# Altium schematic symbol library LATTICEPLDS_Library.SchLib: 291 symbols (part 25 of 32)
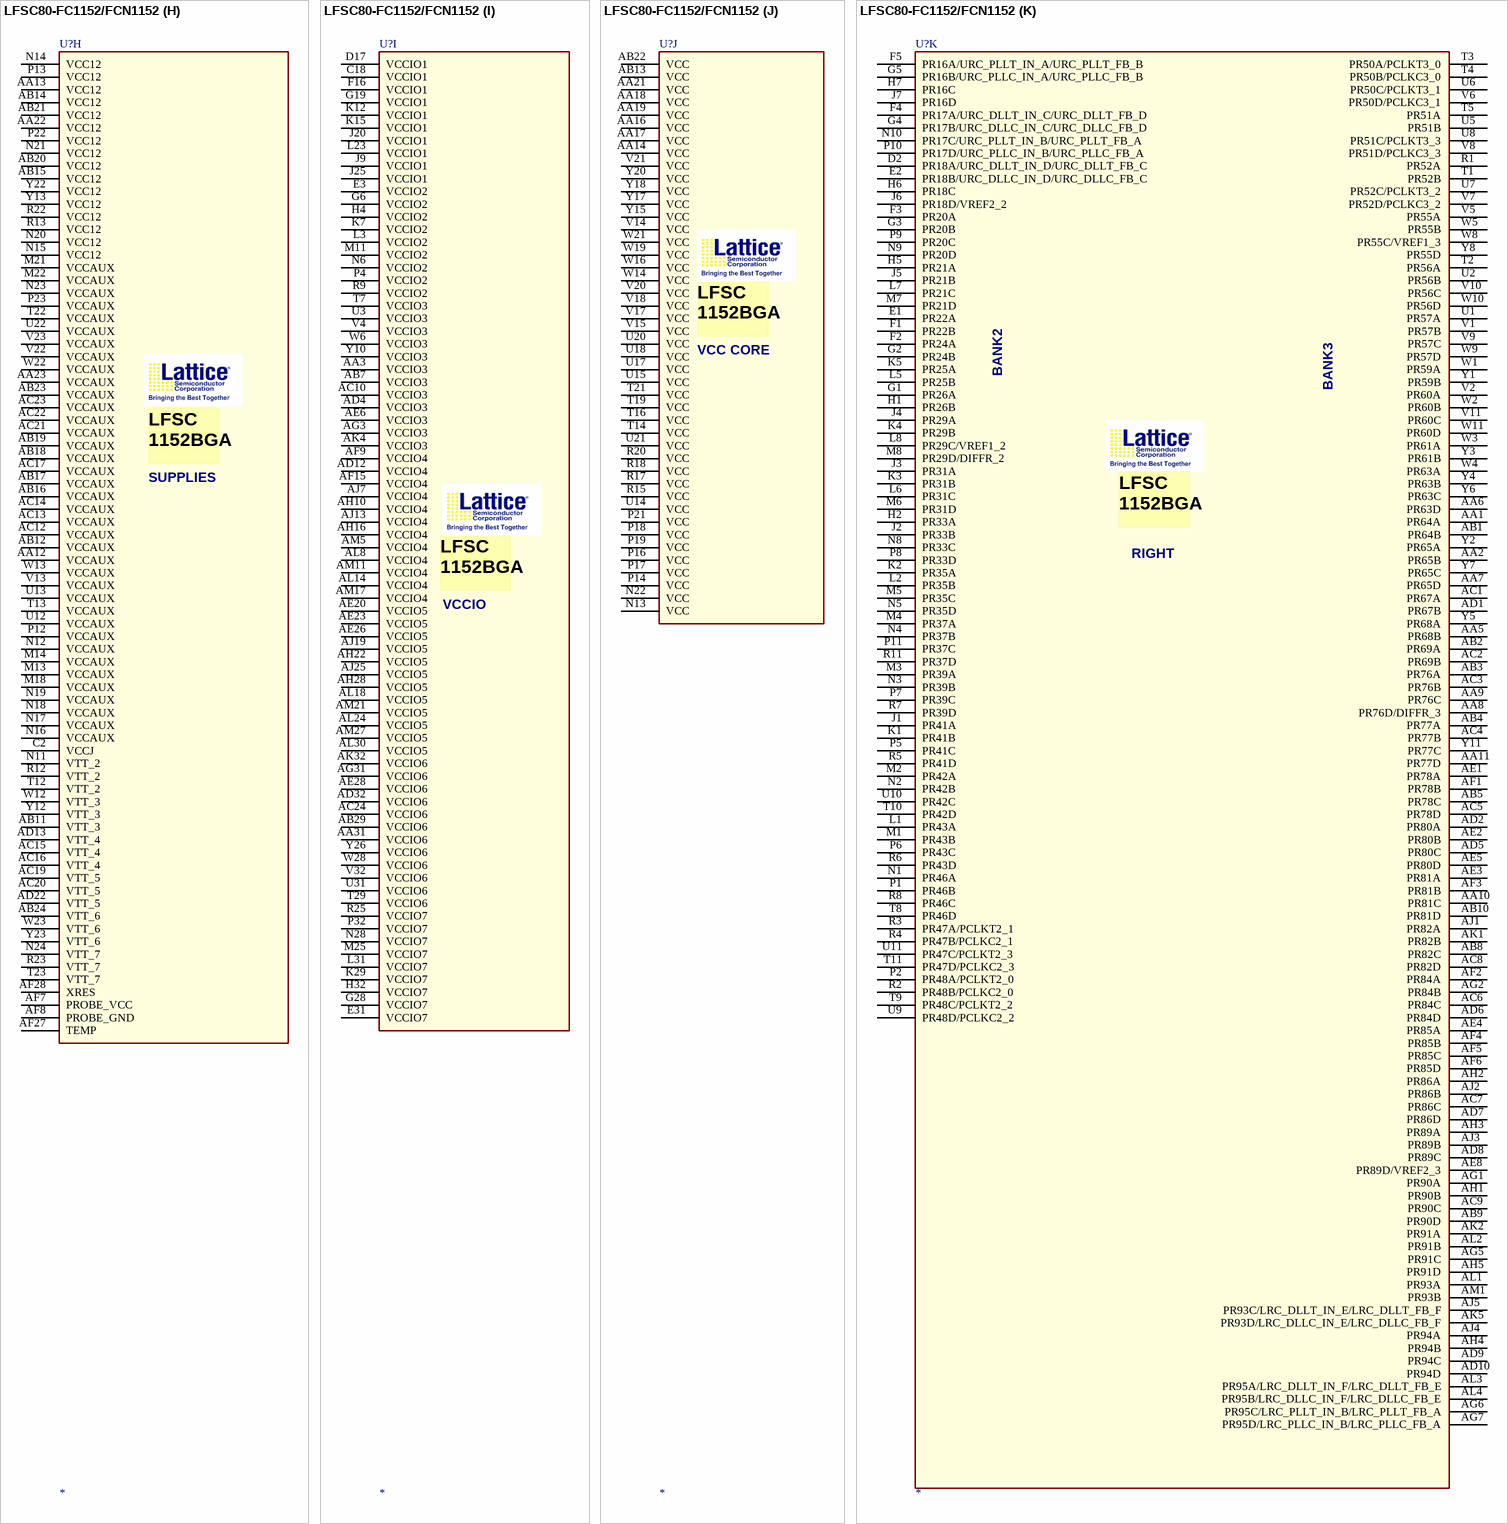
[diagram p327: symbol LFSC80-FC1152/FCN1152]

## LFSC80-FC1152/FCN1152
designator U?
SPLIT_INST: TRUE; SWAP_INFO: (S1+S2+S3+S4+S5+S6+S7+S8+S9+S10+S11)
part A pins: A3 A_HDINP0_R, A4 A_HDOUTP0_R, A5 A_HDOUTP1_R, A6 A_HDINP1_R, A7 A_HDINP2_R, A8 A_HDOUTP2_R, A9 A_HDOUTP3_R, A10 A_HDINP3_R, A11 B_HDOUTP0_R, A12 B_HDOUTP1_R, A13 B_HDOUTP2_R, A14 B_HDOUTP3_R, A21 B_HDOUTP3_L, A22 B_HDOUTP2_L, A23 B_HDOUTP1_L, A24 B_HDOUTP0_L, A25 A_HDINP3_L, A26 A_HDOUTP3_L, A27 A_HDOUTP2_L, A28 A_HDINP2_L, A29 A_HDINP1_L, A30 A_HDOUTP1_L, A31 A_HDOUTP0_L, A32 A_HDINP0_L, B3 A_HDINN0_R, B4 A_HDOUTN0_R, B5 A_HDOUTN1_R, B6 A_HDINN1_R, B7 A_HDINN2_R, B8 A_HDOUTN2_R, B9 A_HDOUTN3_R, B10 A_HDINN3_R, B11 B_HDOUTN0_R, B12 B_HDOUTN1_R, B13 B_HDOUTN2_R, B14 B_HDOUTN3_R, B21 B_HDOUTN3_L, B22 B_HDOUTN2_L, B23 B_HDOUTN1_L, B24 B_HDOUTN0_L, B25 A_HDINN3_L, B26 A_HDOUTN3_L, B27 A_HDOUTN2_L, B28 A_HDINN2_L, B29 A_HDINN1_L, B30 A_HDOUTN1_L, B31 A_HDOUTN0_L, B32 A_HDINN0_L, E10 B_HDINP0_R, E11 B_HDINP1_R, E12 B_HDINP2_R, E13 B_HDINP3_R, E22 B_HDINP3_L, E23 B_HDINP2_L, E24 B_HDINP1_L, E25 B_HDINP0_L, F10 B_HDINN0_R, F11 B_HDINN1_R, F12 B_HDINN2_R, F13 B_HDINN3_R, F22 B_HDINN3_L, F23 B_HDINN2_L, F24 B_HDINN1_L, F25 B_HDINN0_L, G8 A_REFCLKP_R, G9 RESERVED2, G26 RESERVED1, G27 A_REFCLKP_L, H8 A_REFCLKN_R, H9 URC_RESP, H11 B_REFCLKP_R, H12 RESERVED5, H23 RESERVED3, H24 B_REFCLKP_L, H26 ULC_RESP, H27 A_REFCLKN_L, J11 B_REFCLKN_R, J12 RESERVED6, J23 RESERVED4, J24 B_REFCLKN_L
part B pins: C3 A_VDDRX0_R (power), C6 A_VDDRX1_R (power), C7 A_VDDRX2_R (power), C10 A_VDDRX3_R (power), C25 A_VDDRX3_L (power), C28 A_VDDRX2_L (power), C29 A_VDDRX1_L (power), C32 A_VDDRX0_L (power), D3 A_VDDIB0_R (power), D4 A_VDDIB1_R (power), D5 A_VDDIB2_R (power), D6 A_VDDIB3_R (power), D7 B_VDDIB0_R (power), D8 B_VDDIB1_R (power), D9 B_VDDIB2_R (power), D10 B_VDDOB0_R (power), D11 B_VDDOB1_R (power), D12 B_VDDOB2_R (power), D13 B_VDDOB3_R (power), D22 B_VDDOB3_L (power), D23 B_VDDOB2_L (power), D24 B_VDDOB1_L (power), D25 B_VDDOB0_L (power), D26 B_VDDIB2_L (power), D27 B_VDDIB1_L (power), D28 B_VDDIB0_L (power), D29 A_VDDIB3_L (power), D30 A_VDDIB2_L (power), D31 A_VDDIB1_L (power), D32 A_VDDIB0_L (power), E5 A_VDDTX0_R (power), E6 A_VDDTX1_R (power), E7 A_VDDTX2_R (power), E8 A_VDDTX3_R (power), E9 B_VDDIB3_R (power), E26 B_VDDIB3_L (power), E27 A_VDDTX3_L (power), E28 A_VDDTX2_L (power), E29 A_VDDTX1_L (power), E30 A_VDDTX0_L (power), F6 A_VDDOB0_R (power), F7 A_VDDOB1_R (power), F8 A_VDDOB2_R (power), F9 A_VDDOB3_R (power), F26 A_VDDOB3_L (power), F27 A_VDDOB2_L (power), F28 A_VDDOB1_L (power), F29 A_VDDOB0_L (power), G10 B_VDDRX0_R (power), G11 B_VDDRX1_R (power), G12 B_VDDRX2_R (power), G13 B_VDDRX3_R (power), G22 B_VDDRX3_L (power), G23 B_VDDRX2_L (power), G24 B_VDDRX1_L (power), G25 B_VDDRX0_L (power), H10 A_VDDP_R (power), H25 A_VDDP_L (power), K10 B_VDDTX0_R (power), K11 B_VDDTX2_R (power), K24 B_VDDTX2_L (power), K25 B_VDDTX0_L (power), L10 B_VDDTX1_R (power), L11 B_VDDTX3_R (power), L13 B_VDDP_R (power), L22 B_VDDP_L (power), L24 B_VDDTX3_L (power), L25 B_VDDTX1_L (power), M12 VDDAX25_R (power), M23 VDDAX25_L (power)
part C pins: AD11 PB115C, AD14 PB80C/PCLKT4_4, AD15 PB80D/PCLKC4_4, AD16 PB74D/PCLKC4_7, AD17 PB66D, AD18 PB60D, AD19 PB52D/PCLKC5_6, AD20 PB48D/PCLKC5_4, AD21 PB48C/PCLKT5_4, AD24 PB11C, AE10 PB119D, AE11 PB115D, AE13 PB101D, AE14 PB101C, AE16 PB74C/PCLKT4_7, AE17 PB66C, AE18 PB60C, AE19 PB52C/PCLKT5_6, AE21 PB27D, AE22 PB27C, AE24 PB11D, AE25 PB7D, AF10 PB119C, AF11 PB107D, AF12 PB107C, AF13 PB99D, AF14 PB99C, AF16 PB70D, AF17 PB67D, AF18 PB61D, AF19 PB56D, AF21 PB29D, AF22 PB29C, AF23 PB21D, AF24 PB21C, AF25 PB7C, AG8 PB124D, AG9 PB124C, AG10 PB109D, AG11 PB109C, AG12 PB111D, AG13 PB111C, AG14 PB75D/PCLKC4_6, AG15 PB75C/PCLKT4_6, AG16 PB70C, AG17 PB67C, AG18 PB61C, AG19 PB56C, AG20 PB55D, AG21 PB55C, AG22 PB19D, AG23 PB19C, AG24 PB17D, AG25 PB17C, AG26 PB4D, AG27 PB4C, AH6 PB125D/LRC_DLLC_IN_D/LRC_DLLC_FB_C, AH8 PB123D, AH9 PB123C/VREF1_4, AH11 PB79D, AH12 PB79C/DIFFR_4, AH14 PB71D, AH15 PB71C, AH17 PB65D, AH18 PB63D, AH20 PB57D, AH21 PB57C, AH23 PB49D, AH24 PB49C/DIFFR_5, AH26 PB5D/VREF1_5, AH27 PB5C, AH29 PB3C/LLC_DLLT_IN_C/LLC_DLLT_FB_D, AJ6 PB125C/LRC_DLLT_IN_D/LRC_DLLT_FB_C, AJ8 PB117D, AJ9 PB117C, AJ11 PB77D, AJ12 PB77C/VREF2_4, AJ14 PB69D, AJ15 PB69C, AJ17 PB65C, AJ18 PB63C, AJ20 PB59D, AJ21 PB59C, AJ23 PB51D/VREF2_5, AJ24 PB51C, AJ26 PB13D, AJ27 PB13C, AJ29 PB3D/LLC_DLLC_IN_C/LLC_DLLC_FB_D, AK6 PB121D, AK7 PB121C, AK8 PB113D, AK9 PB113C, AK10 PB104D, AK11 PB104C, AK12 PB73D, AK13 PB73C, AK14 PB75B/PCLKC4_1, AK15 PB75A/PCLKT4_1, AK16 PB67B, AK17 PB67A, AK18 PB60B, AK19 PB60A, AK20 PB53B/PCLKC5_2, AK21 PB53A/PCLKT5_2, AK22 PB53D/PCLKC5_7, AK23 PB53C/PCLKT5_7, AK24 PB24D, AK25 PB24C, AK26 PB15D, AK27 PB15C, AK28 PB9D, AK29 PB9C, AL6 PB121B, AL7 PB121A, AL9 PB107B, AL10 PB107A, AL12 PB79B/PCLKC4_5, AL13 PB79A/PCLKT4_5, AL15 PB70B, AL16 PB70A, AL19 PB56B, AL20 PB56A, AL22 PB49B/PCLKC5_5, AL23 PB49A/PCLKT5_5, AL25 PB19B, AL26 PB19A, AL28 PB5B, AL29 PB5A, AM2 PB125B/LRC_PLLC_IN_A/LRC_PLLC_FB_B, AM3 PB124A/LRC_DLLT_IN_C/LRC_DLLT_FB_D, AM4 PB124B/LRC_DLLC_IN_C/LRC_DLLC_FB_D, AM6 PB117B, AM7 PB117A, AM9 PB101B, AM10 PB101A, AM12 PB77B/PCLKC4_0, AM13 PB77A/PCLKT4_0, AM15 PB69B, AM16 PB69A, AM19 PB59B, AM20 PB59A, AM22 PB51B/PCLKC5_0, AM23 PB51A/PCLKT5_0, AM25 PB29B, AM26 PB29A, AM28 PB13B, AM29 PB13A, AM31 PB4B/LLC_DLLC_IN_D/LLC_DLLC_FB_C, AM32 PB4A/LLC_DLLT_IN_D/LLC_DLLT_FB_C, AM33 PB3A/LLC_PLLT_IN_A/LLC_PLLT_FB_B, AN2 PB125A/LRC_PLLT_IN_A/LRC_PLLT_FB_B, AN3 PB119B, AN4 PB123B, AN5 PB123A, AN6 PB113B, AN7 PB113A, AN8 PB109B, AN9 PB109A, AN10 PB99B, AN11 PB99A, AN12 PB80B/PCLKC4_3, AN13 PB80A/PCLKT4_3, AN14 PB74B/PCLKC4_2, AN15 PB74A/PCLKT4_2, AN16 PB66B, AN17 PB66A, AN18 PB61B, AN19 PB61A, AN20 PB52B/PCLKC5_1, AN21 PB52A/PCLKT5_1, AN22 PB45B, AN23 PB45A, AN24 PB27B, AN25 PB27A, AN26 PB21B, AN27 PB21A, AN28 PB17B, AN29 PB17A, AN30 PB9B, AN31 PB9A, AN32 PB7A/ODT0, AN33 PB3B/LLC_PLLC_IN_A/LLC_PLLC_FB_B, AP3 PB119A, AP4 PB115B, AP5 PB115A, AP6 PB111B, AP7 PB111A, AP8 PB104B, AP9 PB104A, AP10 PB83B, AP11 PB83A, AP12 PB73B, AP13 PB73A, AP14 PB71B, AP15 PB71A, AP16 PB65B, AP17 PB65A, AP18 PB63B, AP19 PB63A, AP20 PB57B, AP21 PB57A, AP22 PB55B, AP23 PB55A, AP24 PB48B/PCLKC5_3, AP25 PB48A/PCLKT5_3, AP26 PB24B, AP27 PB24A, AP28 PB15B, AP29 PB15A, AP30 PB11B, AP31 PB11A, AP32 PB7B
part D pins: AA24 PL77D, AA25 PL81C, AA26 PL76C, AA27 PL76D/DIFFR_6, AA28 PL65D, AA29 PL63D, AA30 PL68B, AA33 PL65B, AA34 PL64A, AB25 PL81D, AB26 PL90D, AB27 PL82C, AB30 PL78C, AB31 PL77A, AB32 PL76A, AB33 PL69A, AB34 PL64B, AC26 PL90C, AC27 PL82D, AC28 PL86C, AC29 PL84C, AC30 PL78D, AC31 PL77B, AC32 PL76B, AC33 PL69B, AC34 PL67A, AD25 PL94D, AD26 PL94C, AD27 PL89C, AD28 PL86D, AD29 PL84D, AD30 PL80C, AD33 PL80A, AD34 PL67B, AE27 PL89D/VREF2_6, AE30 PL80D, AE31 PL85A, AE32 PL81A, AE33 PL80B, AE34 PL78A, AF29 PL85D, AF30 PL85C, AF31 PL85B, AF32 PL81B, AF33 PL84A, AF34 PL78B, AG28 PL95D/LLC_PLLC_IN_B/LLC_PLLC_FB_A, AG29 PL95C/LLC_PLLT_IN_B/LLC_PLLT_FB_A, AG30 PL91C, AG33 PL84B, AG34 PL90A, AH30 PL91D, AH31 PL94B, AH32 PL89A, AH33 PL86A, AH34 PL90B, AJ30 PL93C/LLC_DLLT_IN_E/LLC_DLLT_FB_F, AJ31 PL94A, AJ32 PL89B, AJ33 PL86B, AJ34 PL82A, AK30 PL93D/LLC_DLLC_IN_E/LLC_DLLC_FB_F, AK33 PL91A, AK34 PL82B, AL31 PL95B/LLC_DLLC_IN_F/LLC_DLLC_FB_E, AL32 PL95A/LLC_DLLT_IN_F/LLC_DLLT_FB_E, AL33 PL91B, AL34 PL93A, AM34 PL93B, D33 PL18A/ULC_DLLT_IN_D/ULC_DLLT_FB_C, E33 PL18B/ULC_DLLC_IN_D/ULC_DLLC_FB_C, E34 PL22A, F30 PL16A/ULC_PLLT_IN_A/ULC_PLLT_FB_B/DEBUG_BUS11, F31 PL17A/ULC_DLLT_IN_C/ULC_DLLT_FB_D/DEBUG_BUS9, F32 PL20A, F33 PL24A, F34 PL22B, G30 PL16B/ULC_PLLC_IN_A/ULC_PLLC_FB_B/DEBUG_BUS10, G31 PL17B/ULC_DLLC_IN_C/ULC_DLLC_FB_D/DEBUG_BUS8, G32 PL20B, G33 PL24B, G34 PL26A, H28 PL16C/DEBUG_BUS13, H29 PL18C/DEBUG_BUS12, H30 PL21A, H33 PL33A, H34 PL26B, J28 PL16D, J29 PL18D/VREF2_7/DEBUG_BUS6, J30 PL21B, J31 PL29A/TESTCFGN, J32 PL31A, J33 PL33B, J34 PL41A, K30 PL25A, K31 PL29B/DEBUG_BUS7, K32 PL31B, K33 PL35A, K34 PL41B, L27 PL29C/VREF1_7/DEBUG_BUS5, L28 PL21C, L29 PL31C, L30 PL25B, L33 PL35B, L34 PL43A, M27 PL29D/DIFFR_7/DEBUG_BUS4, M28 PL21D, M29 PL31D, M30 PL35C, M31 PL37A, M32 PL39A, M33 PL42A, M34 PL43B, N25 PL17C/ULC_PLLT_IN_B/ULC_PLLT_FB_A, N26 PL20D, N27 PL33C, N30 PL35D, N31 PL37B, N32 PL39B, N33 PL42B, N34 PL46A, P24 PL37C, P25 PL17D/ULC_PLLC_IN_B/ULC_PLLC_FB_A, P26 PL20C, P27 PL33D, P28 PL39C, P29 PL43C, P30 PL41C, P33 PL48A/PCLKT7_0/DEBUG_BUS1, P34 PL46B, R24 PL37D, R27 PL46C, R28 PL39D, R29 PL43D, R30 PL41D, R31 PL47B/PCLKC7_1/DEBUG_BUS2, R32 PL47A/PCLKT7_1/DEBUG_BUS3, R33 PL48B/PCLKC7_0/DEBUG_BUS0, R34 PL52A, T24 PL47D/PCLKC7_3, T25 PL42D, T26 PL48C/PCLKT7_2/DEBUG_BUS14, T27 PL46D, T30 PL51A, T31 PL50B/PCLKC6_0, T32 PL50A/PCLKT6_0, T33 PL56A, T34 PL52B, U24 PL47C/PCLKT7_3, U25 PL42C, U26 PL48D/PCLKC7_2/DEBUG_BUS15, U27 PL51C/PCLKT6_3, U28 PL52C/PCLKT6_2, U29 PL50C/PCLKT6_1, U30 PL51B, U33 PL56B, U34 PL57A, V24 PL60C, V25 PL56C, V26 PL57C, V27 PL51D/PCLKC6_3, V28 PL52D/PCLKC6_2, V29 PL50D/PCLKC6_1, V30 PL55A, V33 PL60A, V34 PL57B, W24 PL60D, W25 PL56D, W26 PL57D, W27 PL55C/VREF1_6, W30 PL55B, W31 PL63A, W32 PL61A, W33 PL60B, W34 PL59A, Y24 PL77C, Y27 PL55D, Y28 PL65C, Y29 PL63C, Y30 PL68A, Y31 PL63B, Y32 PL61B, Y33 PL65A, Y34 PL59B
part E pins: A2 GND (power), A33 GND (power), AA4 GND (power), AA15 GND (power), AA20 GND (power), AA32 GND (power), AB6 GND (power), AB28 GND (power), AC11 GND (power), AC18 GND (power), AC25 GND (power), AD3 GND (power), AD23 GND (power), AD31 GND (power), AE7 GND (power), AE9 GND (power), AE12 GND (power), AE15 GND (power), AE29 GND (power), AF20 GND (power), AF26 GND (power), AG4 GND (power), AG32 GND (power), AH7 GND (power), AH13 GND (power), AH19 GND (power), AH25 GND (power), AJ10 GND (power), AJ16 GND (power), AJ22 GND (power), AJ28 GND (power), AK3 GND (power), AK31 GND (power), AL5 GND (power), AL11 GND (power), AL17 GND (power), AL21 GND (power), AL27 GND (power), AM8 GND (power), AM14 GND (power), AM18 GND (power), AM24 GND (power), AM30 GND (power), AN1 GND (power), AN34 GND (power), AP2 GND (power), AP33 GND (power), B1 GND (power), B34 GND (power), C4 GND (power), C5 GND (power), C8 GND (power), C9 GND (power), C11 GND (power), C12 GND (power), C13 GND (power), C14 GND (power), C17 GND (power), C21 GND (power), C22 GND (power), C23 GND (power), C24 GND (power), C26 GND (power), C27 GND (power), C30 GND (power), C31 GND (power), D18 GND (power), E4 GND (power), E32 GND (power), F19 GND (power), G7 GND (power), G16 GND (power), G29 GND (power), H3 GND (power), H31 GND (power), J10 GND (power), J15 GND (power), J26 GND (power), K6 GND (power), K9 GND (power), K20 GND (power), K23 GND (power), K26 GND (power), K28 GND (power), L4 GND (power), L12 GND (power), L32 GND (power), M10 GND (power), M17 GND (power), M24 GND (power), N7 GND (power), N29 GND (power), P3 GND (power), P15 GND (power), P20 GND (power), P31 GND (power), R10 GND (power), R14 GND (power), R16 GND (power), R19 GND (power), R21 GND (power), R26 GND (power), T6 GND (power), T15 GND (power), T17 GND (power), T18 GND (power), T20 GND (power), T28 GND (power), U4 GND (power), U16 GND (power), U19 GND (power), U23 GND (power), U32 GND (power), V3 GND (power), V12 GND (power), V16 GND (power), V19 GND (power), V31 GND (power), W7 GND (power), W15 GND (power), W17 GND (power), W18 GND (power), W20 GND (power), W29 GND (power), Y9 GND (power), Y14 GND (power), Y16 GND (power), Y19 GND (power), Y21 GND (power), Y25 GND (power)
part F pins: A15 PT73A/D1, A16 PT71B/D0, A17 PT65B/PCLKC1_0, A18 PT59B/A7, A19 PT57B/A9, A20 PT55B/A13, B2 CCLK, B15 PT73B/D2, B16 PT71A/QOUT, B17 PT65A/MPICLK/PCLKT1_0, B18 PT59A/A8, B19 PT57A/A10, B20 PT55A/A14, B33 RESETN, C1 TDI, C15 PT67B/EXTCLKP2O, C16 PT67A/EXTCLKP2I, C19 PT61A/A4, C20 PT61B/A3, C33 INITN, C34 RDCFGN, D1 TCK, D14 PT75B/CS0N, D15 PT70B/DOUT, D16 PT69B/EXTCLKP1O, D19 PT60B/A5, D20 PT53B/A15, D21 PT52B/A18, D34 DONE, E14 PT75A/RDN, E15 PT70A/EXTDONEI, E16 PT69A/EXTCLKP1I, E17 PT66B/DP0, E18 PT63B/MPIRTRYN, E19 PT60A/A6, E20 PT53A/A17, E21 PT52A/MPITEAN, F14 PT77B/D8, F15 PT74A/D5, F17 PT66A/MPIACKN, F18 PT63A/A0, F20 PT56B/A11, F21 PT51B/A21, G14 PT77A/CS1, G15 PT74B/D6, G17 PT65D/D23, G18 PT63D/DP3/PCLKC1_4, G20 PT56A/A12, G21 PT51A/D15, H13 PT70C/D18, H14 PT71C/D17/PCLKT1_3, H15 PT67D/D21/PCLKC1_1, H16 PT67C/D22/PCLKT1_1, H17 PT65C/DP2, H18 PT63C/D24/PCLKT1_4, H19 PT59D/D27, H20 PT59C/VREF1_1, H21 PT57D/D28/PCLKC1_6, H22 PT56D/D30/PCLKC1_7, J8 PROGRAMN, J13 PT70D/VREF2_1, J14 PT71D/D16/PCLKC1_3, J16 PT69D/D19/PCLKC1_2, J17 PT69C/D20/PCLKT1_2, J18 PT61D/A1, J19 PT61C/A2, J21 PT57C/D29/PCLKT1_6, J22 PT56C/D31/PCLKT1_7, J27 M0, K8 MPIIRQN, K13 PT73C/D3, K14 PT73D/D4, K16 PT74C/D7, K17 PT66C/RDY, K18 PT60D/D25/PCLKC1_5, K19 PT52C/A20, K21 PT55D/D11, K22 PT55C/D12, K27 M1, L9 TMS, L14 PT75C/D10, L15 PT75D/D9, L16 PT74D/WRN, L17 PT66D/EXTDONEO, L18 PT60C/D26/PCLKT1_5, L19 PT52D/A19, L20 PT53C/D13, L21 PT53D/A16, L26 M3, M9 TDO, M15 PT77D/HDC, M16 PT77C/LDCN, M19 PT51C/DP1, M20 PT51D/D14, M26 M2
part G pins: A1 NC1, A34 NC2, AP1 NC3, AP34 NC4
part H pins: AA12 VCCAUX (power), AA13 VCC12 (power), AA22 VCC12 (power), AA23 VCCAUX (power), AB11 VTT_3 (power), AB12 VCCAUX (power), AB14 VCC12 (power), AB15 VCC12 (power), AB16 VCCAUX (power), AB17 VCCAUX (power), AB18 VCCAUX (power), AB19 VCCAUX (power), AB20 VCC12 (power), AB21 VCC12 (power), AB23 VCCAUX (power), AB24 VTT_6 (power), AC12 VCCAUX (power), AC13 VCCAUX (power), AC14 VCCAUX (power), AC15 VTT_4 (power), AC16 VTT_4 (power), AC17 VCCAUX (power), AC19 VTT_5 (power), AC20 VTT_5 (power), AC21 VCCAUX (power), AC22 VCCAUX (power), AC23 VCCAUX (power), AD13 VTT_4 (power), AD22 VTT_5 (power), AF7 PROBE_VCC, AF8 PROBE_GND, AF27 TEMP, AF28 XRES, C2 VCCJ (power), M13 VCCAUX (power), M14 VCCAUX (power), M18 VCCAUX (power), M21 VCCAUX (power), M22 VCCAUX (power), N11 VTT_2 (power), N12 VCCAUX (power), N14 VCC12 (power), N15 VCC12 (power), N16 VCCAUX (power), N17 VCCAUX (power), N18 VCCAUX (power), N19 VCCAUX (power), N20 VCC12 (power), N21 VCC12 (power), N23 VCCAUX (power), N24 VTT_7 (power), P12 VCCAUX (power), P13 VCC12 (power), P22 VCC12 (power), P23 VCCAUX (power), R12 VTT_2 (power), R13 VCC12 (power), R22 VCC12 (power), R23 VTT_7 (power), T12 VTT_2 (power), T13 VCCAUX (power), T22 VCCAUX (power), T23 VTT_7 (power), U12 VCCAUX (power), U13 VCCAUX (power), U22 VCCAUX (power), V13 VCCAUX (power), V22 VCCAUX (power), V23 VCCAUX (power), W12 VTT_3 (power), W13 VCCAUX (power), W22 VCCAUX (power), W23 VTT_6 (power), Y12 VTT_3 (power), Y13 VCC12 (power), Y22 VCC12 (power), Y23 VTT_6 (power)
part I pins: AA3 VCCIO3 (power), AA31 VCCIO6 (power), AB7 VCCIO3 (power), AB29 VCCIO6 (power), AC10 VCCIO3 (power), AC24 VCCIO6 (power), AD4 VCCIO3 (power), AD12 VCCIO4 (power), AD32 VCCIO6 (power), AE6 VCCIO3 (power), AE20 VCCIO5 (power), AE23 VCCIO5 (power), AE26 VCCIO5 (power), AE28 VCCIO6 (power), AF9 VCCIO4 (power), AF15 VCCIO4 (power), AG3 VCCIO3 (power), AG31 VCCIO6 (power), AH10 VCCIO4 (power), AH16 VCCIO4 (power), AH22 VCCIO5 (power), AH28 VCCIO5 (power), AJ7 VCCIO4 (power), AJ13 VCCIO4 (power), AJ19 VCCIO5 (power), AJ25 VCCIO5 (power), AK4 VCCIO3 (power), AK32 VCCIO6 (power), AL8 VCCIO4 (power), AL14 VCCIO4 (power), AL18 VCCIO5 (power), AL24 VCCIO5 (power), AL30 VCCIO5 (power), AM5 VCCIO4 (power), AM11 VCCIO4 (power), AM17 VCCIO4 (power), AM21 VCCIO5 (power), AM27 VCCIO5 (power), C18 VCCIO1 (power), D17 VCCIO1 (power), E3 VCCIO2 (power), E31 VCCIO7 (power), F16 VCCIO1 (power), G6 VCCIO2 (power), G19 VCCIO1 (power), G28 VCCIO7 (power), H4 VCCIO2 (power), H32 VCCIO7 (power), J9 VCCIO1 (power), J20 VCCIO1 (power), J25 VCCIO1 (power), K7 VCCIO2 (power), K12 VCCIO1 (power), K15 VCCIO1 (power), K29 VCCIO7 (power), L3 VCCIO2 (power), L23 VCCIO1 (power), L31 VCCIO7 (power), M11 VCCIO2 (power), M25 VCCIO7 (power), N6 VCCIO2 (power), N28 VCCIO7 (power), P4 VCCIO2 (power), P32 VCCIO7 (power), R9 VCCIO2 (power), R25 VCCIO7 (power), T7 VCCIO3 (power), T29 VCCIO6 (power), U3 VCCIO3 (power), U31 VCCIO6 (power), V4 VCCIO3 (power), V32 VCCIO6 (power), W6 VCCIO3 (power), W28 VCCIO6 (power), Y10 VCCIO3 (power), Y26 VCCIO6 (power)
part J pins: AA14 VCC (power), AA16 VCC (power), AA17 VCC (power), AA18 VCC (power), AA19 VCC (power), AA21 VCC (power), AB13 VCC (power), AB22 VCC (power), N13 VCC (power), N22 VCC (power), P14 VCC (power), P16 VCC (power), P17 VCC (power), P18 VCC (power), P19 VCC (power), P21 VCC (power), R15 VCC (power), R17 VCC (power), R18 VCC (power), R20 VCC (power), T14 VCC (power), T16 VCC (power), T19 VCC (power), T21 VCC (power), U14 VCC (power), U15 VCC (power), U17 VCC (power), U18 VCC (power), U20 VCC (power), U21 VCC (power), V14 VCC (power), V15 VCC (power), V17 VCC (power), V18 VCC (power), V20 VCC (power), V21 VCC (power), W14 VCC (power), W16 VCC (power), W19 VCC (power), W21 VCC (power), Y15 VCC (power), Y17 VCC (power), Y18 VCC (power), Y20 VCC (power)
part K pins: AA1 PR64A, AA2 PR65B, AA5 PR68B, AA6 PR63D, AA7 PR65D, AA8 PR76D/DIFFR_3, AA9 PR76C, AA10 PR81C, AA11 PR77D, AB1 PR64B, AB2 PR69A, AB3 PR76A, AB4 PR77A, AB5 PR78C, AB8 PR82C, AB9 PR90D, AB10 PR81D, AC1 PR67A, AC2 PR69B, AC3 PR76B, AC4 PR77B, AC5 PR78D, AC6 PR84C, AC7 PR86C, AC8 PR82D, AC9 PR90C, AD1 PR67B, AD2 PR80A, AD5 PR80C, AD6 PR84D, AD7 PR86D, AD8 PR89C, AD9 PR94C, AD10 PR94D, AE1 PR78A, AE2 PR80B, AE3 PR81A, AE4 PR85A, AE5 PR80D, AE8 PR89D/VREF2_3, AF1 PR78B, AF2 PR84A, AF3 PR81B, AF4 PR85B, AF5 PR85C, AF6 PR85D, AG1 PR90A, AG2 PR84B, AG5 PR91C, AG6 PR95C/LRC_PLLT_IN_B/LRC_PLLT_FB_A, AG7 PR95D/LRC_PLLC_IN_B/LRC_PLLC_FB_A, AH1 PR90B, AH2 PR86A, AH3 PR89A, AH4 PR94B, AH5 PR91D, AJ1 PR82A, AJ2 PR86B, AJ3 PR89B, AJ4 PR94A, AJ5 PR93C/LRC_DLLT_IN_E/LRC_DLLT_FB_F, AK1 PR82B, AK2 PR91A, AK5 PR93D/LRC_DLLC_IN_E/LRC_DLLC_FB_F, AL1 PR93A, AL2 PR91B, AL3 PR95A/LRC_DLLT_IN_F/LRC_DLLT_FB_E, AL4 PR95B/LRC_DLLC_IN_F/LRC_DLLC_FB_E, AM1 PR93B, D2 PR18A/URC_DLLT_IN_D/URC_DLLT_FB_C, E1 PR22A, E2 PR18B/URC_DLLC_IN_D/URC_DLLC_FB_C, F1 PR22B, F2 PR24A, F3 PR20A, F4 PR17A/URC_DLLT_IN_C/URC_DLLT_FB_D, F5 PR16A/URC_PLLT_IN_A/URC_PLLT_FB_B, G1 PR26A, G2 PR24B, G3 PR20B, G4 PR17B/URC_DLLC_IN_C/URC_DLLC_FB_D, G5 PR16B/URC_PLLC_IN_A/URC_PLLC_FB_B, H1 PR26B, H2 PR33A, H5 PR21A, H6 PR18C, H7 PR16C, J1 PR41A, J2 PR33B, J3 PR31A, J4 PR29A, J5 PR21B, J6 PR18D/VREF2_2, J7 PR16D, K1 PR41B, K2 PR35A, K3 PR31B, K4 PR29B, K5 PR25A, L1 PR43A, L2 PR35B, L5 PR25B, L6 PR31C, L7 PR21C, L8 PR29C/VREF1_2, M1 PR43B, M2 PR42A, M3 PR39A, M4 PR37A, M5 PR35C, M6 PR31D, M7 PR21D, M8 PR29D/DIFFR_2, N1 PR46A, N2 PR42B, N3 PR39B, N4 PR37B, N5 PR35D, N8 PR33C, N9 PR20D, N10 PR17C/URC_PLLT_IN_B/URC_PLLT_FB_A, P1 PR46B, P2 PR48A/PCLKT2_0, P5 PR41C, P6 PR43C, P7 PR39C, P8 PR33D, P9 PR20C, P10 PR17D/URC_PLLC_IN_B/URC_PLLC_FB_A, P11 PR37C, R1 PR52A, R2 PR48B/PCLKC2_0, R3 PR47A/PCLKT2_1, R4 PR47B/PCLKC2_1, R5 PR41D, R6 PR43D, R7 PR39D, R8 PR46C, R11 PR37D, T1 PR52B, T2 PR56A, T3 PR50A/PCLKT3_0, T4 PR50B/PCLKC3_0, T5 PR51A, T8 PR46D, T9 PR48C/PCLKT2_2, T10 PR42D, T11 PR47D/PCLKC2_3, U1 PR57A, U2 PR56B, U5 PR51B, U6 PR50C/PCLKT3_1, U7 PR52C/PCLKT3_2, U8 PR51C/PCLKT3_3, U9 PR48D/PCLKC2_2, U10 PR42C, U11 PR47C/PCLKT2_3, V1 PR57B, V2 PR60A, V5 PR55A, V6 PR50D/PCLKC3_1, V7 PR52D/PCLKC3_2, V8 PR51D/PCLKC3_3, V9 PR57C, V10 PR56C, V11 PR60C, W1 PR59A, W2 PR60B, W3 PR61A, W4 PR63A, W5 PR55B, W8 PR55C/VREF1_3, W9 PR57D, W10 PR56D, W11 PR60D, Y1 PR59B, Y2 PR65A, Y3 PR61B, Y4 PR63B, Y5 PR68A, Y6 PR63C, Y7 PR65C, Y8 PR55D, Y11 PR77C
part A text: LFSC-1152BGA; SERDES
part B text: LFSC / 1152BGA; ANALOG POWER
part C text: BANK 5; BANK 4; LFSC / 1152BGA; BOTTOM
part D text: LFSC / 1152BGA; LEFT /; BANK7; BANK6
part E text: LFSC / 1152BGA; VSS
part F text: LFSC / 1152BGA; CONFIG/TOP
part H text: LFSC / 1152BGA; SUPPLIES
part I text: LFSC / 1152BGA; VCCIO
part J text: LFSC / 1152BGA; VCC CORE
part K text: BANK2; BANK3; LFSC / 1152BGA; RIGHT

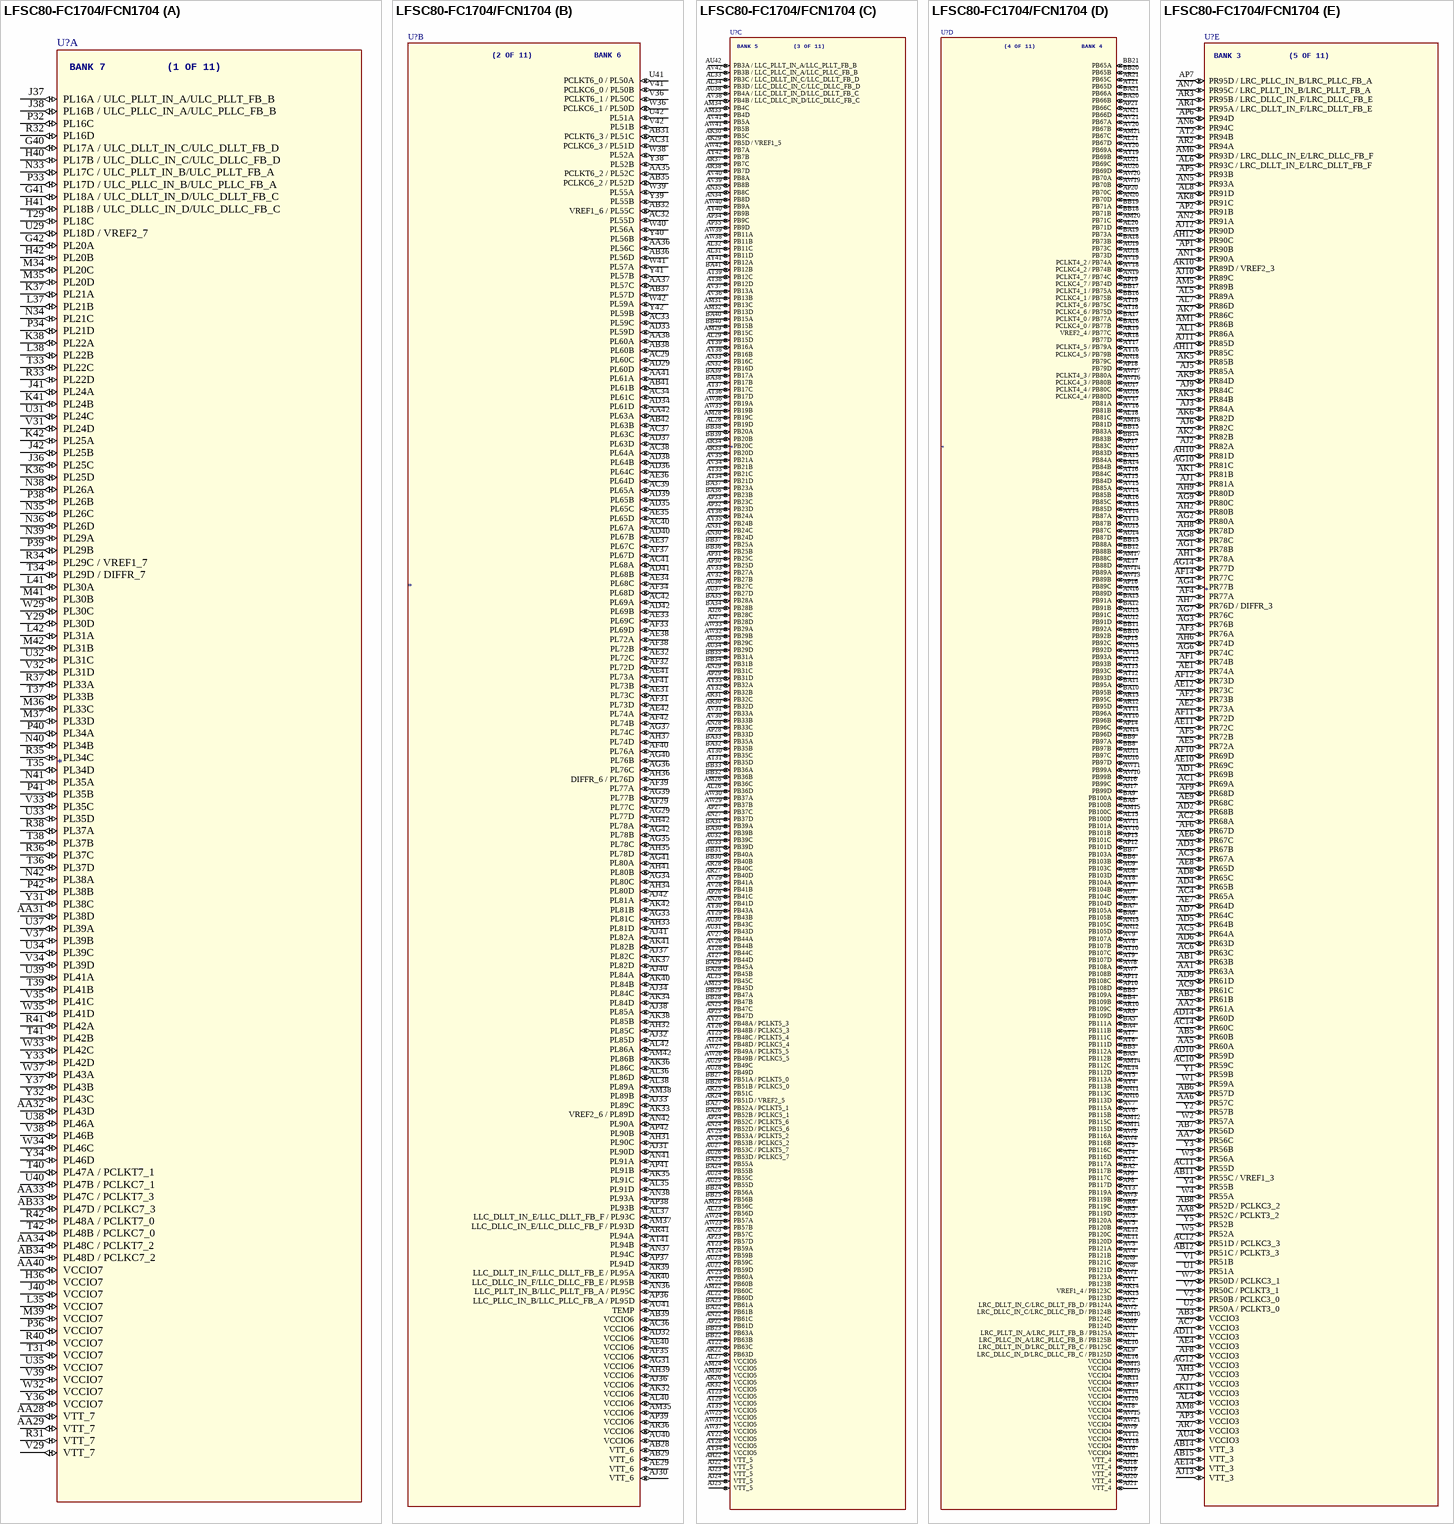
[diagram p240: symbol LFSC80-FC1704/FCN1704]

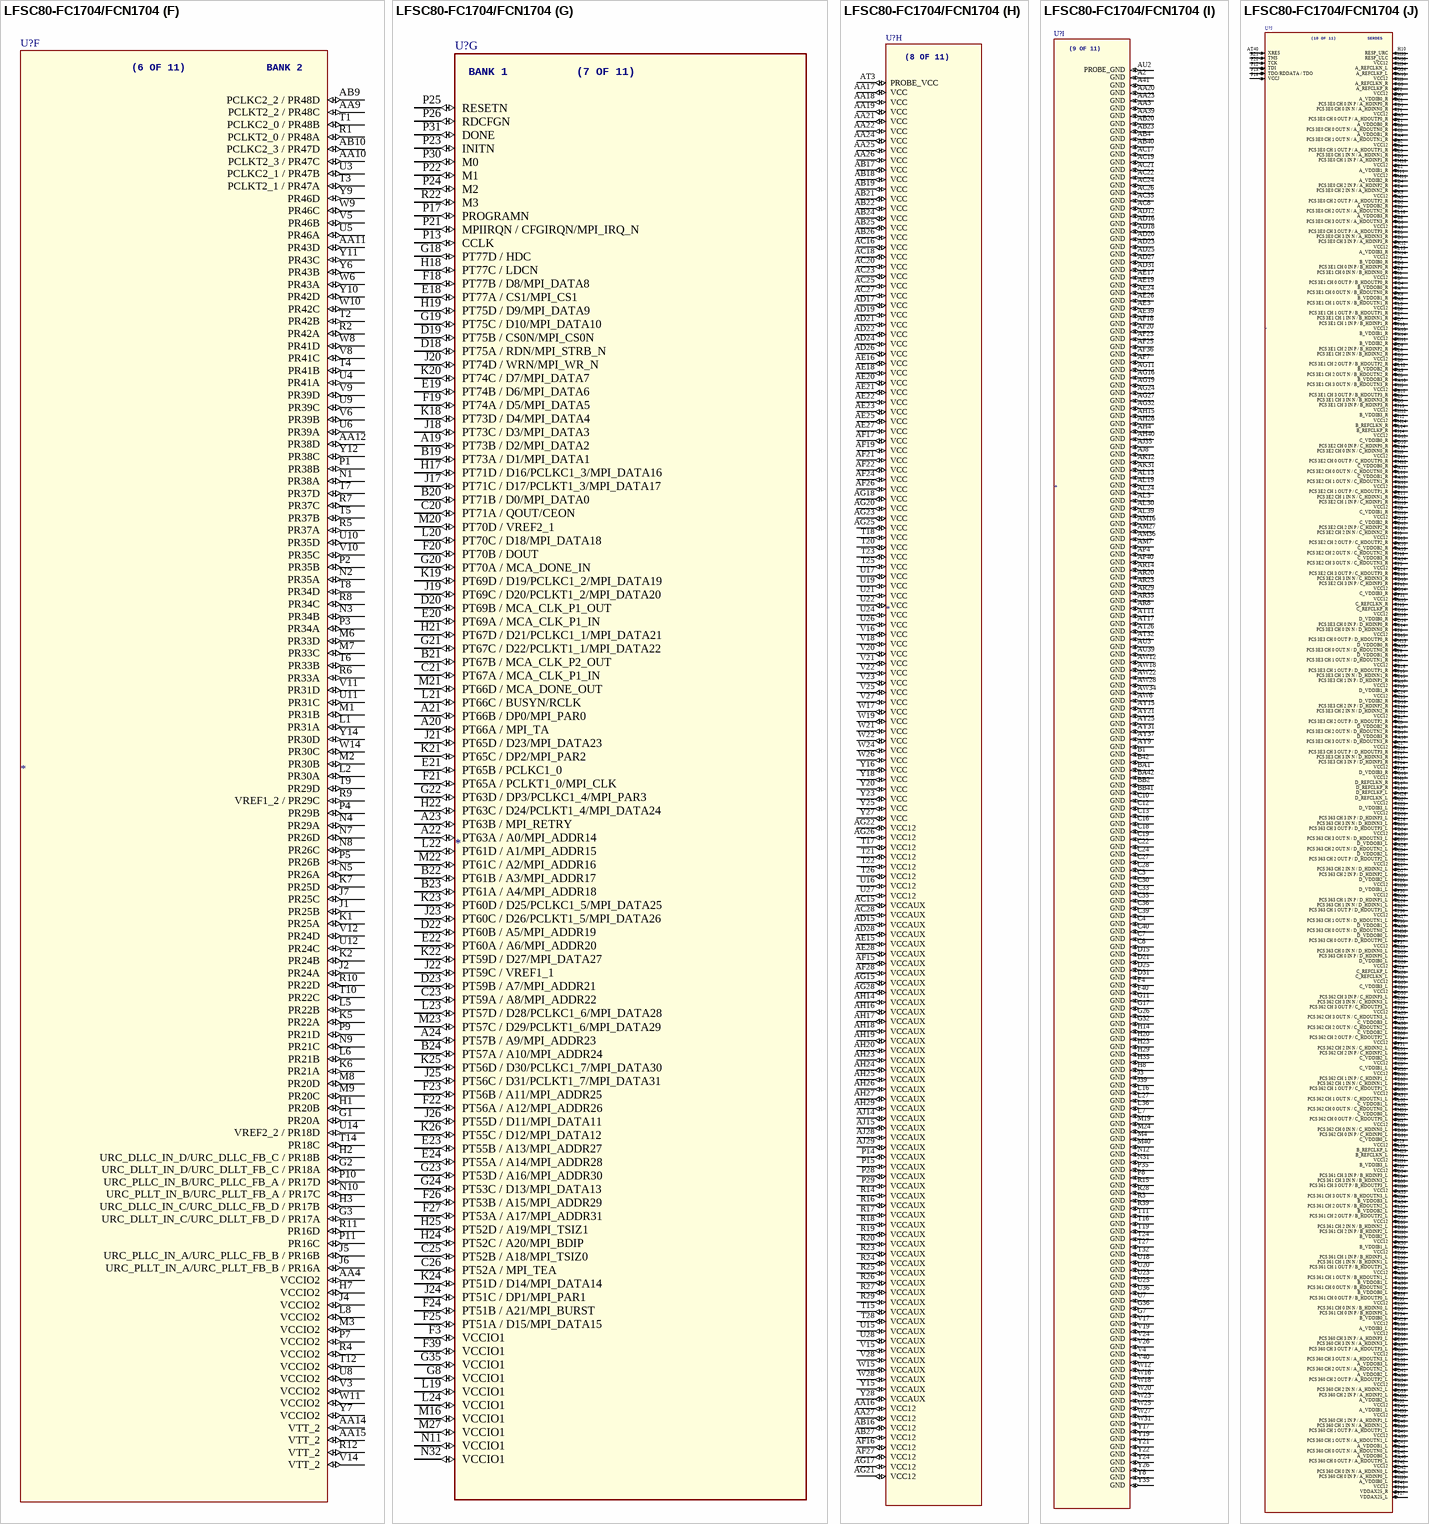
[diagram p241: symbol LFSC80-FC1704/FCN1704]

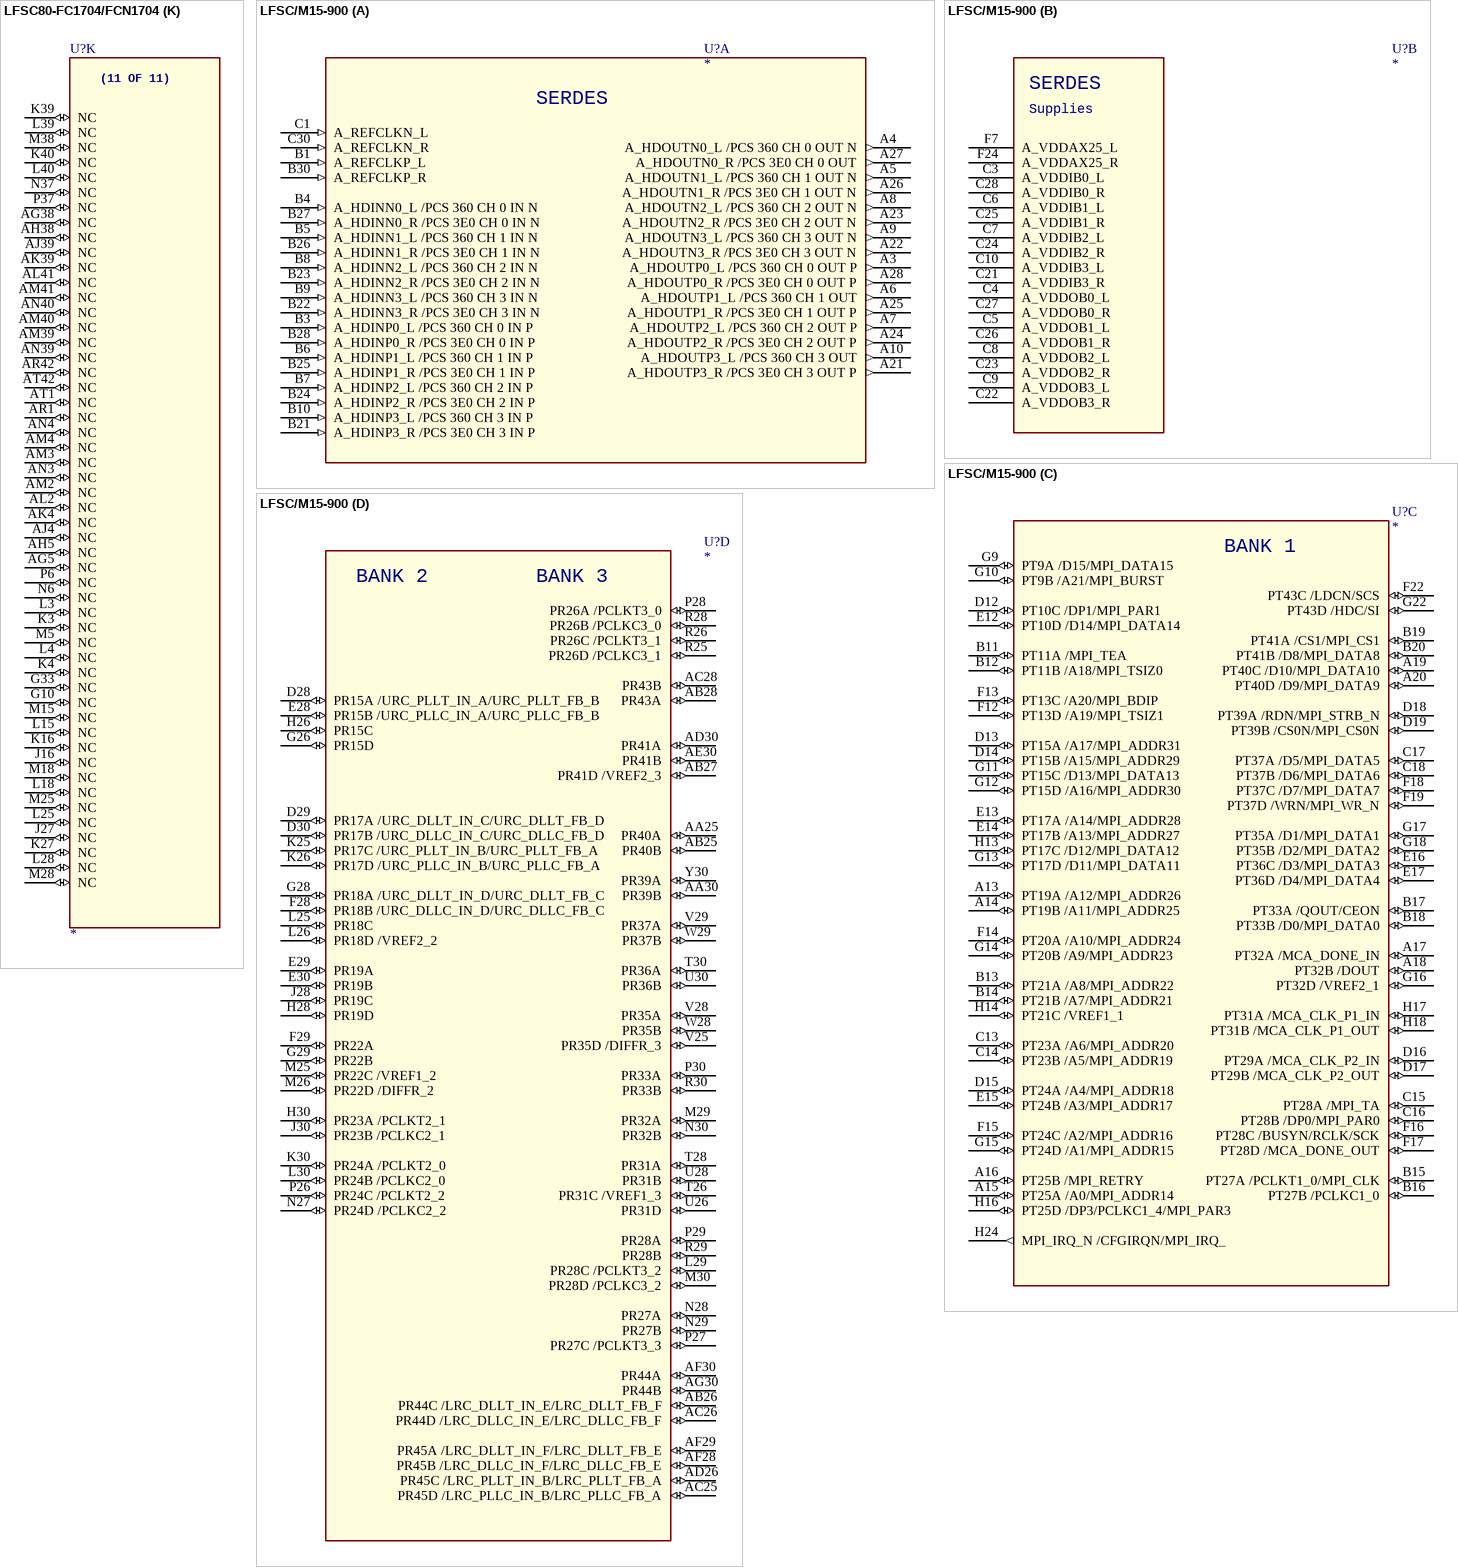
[diagram p242: symbols LFSC80-FC1704/FCN1704 to LFSC/M15-900]